# Altium footprint library Components.PcbLib: 127 footprints (part 2 of 8)
Each footprint in its own frame and in the unit in brackets; x right, y up, seen from the top. Pads: shape width x height; smd on the part's side, far side on the other; paste and mask are expansions set on the pad; w line width, h text height; cw(c..) or ccw(c..) is an arc to the next point about the centre after c.
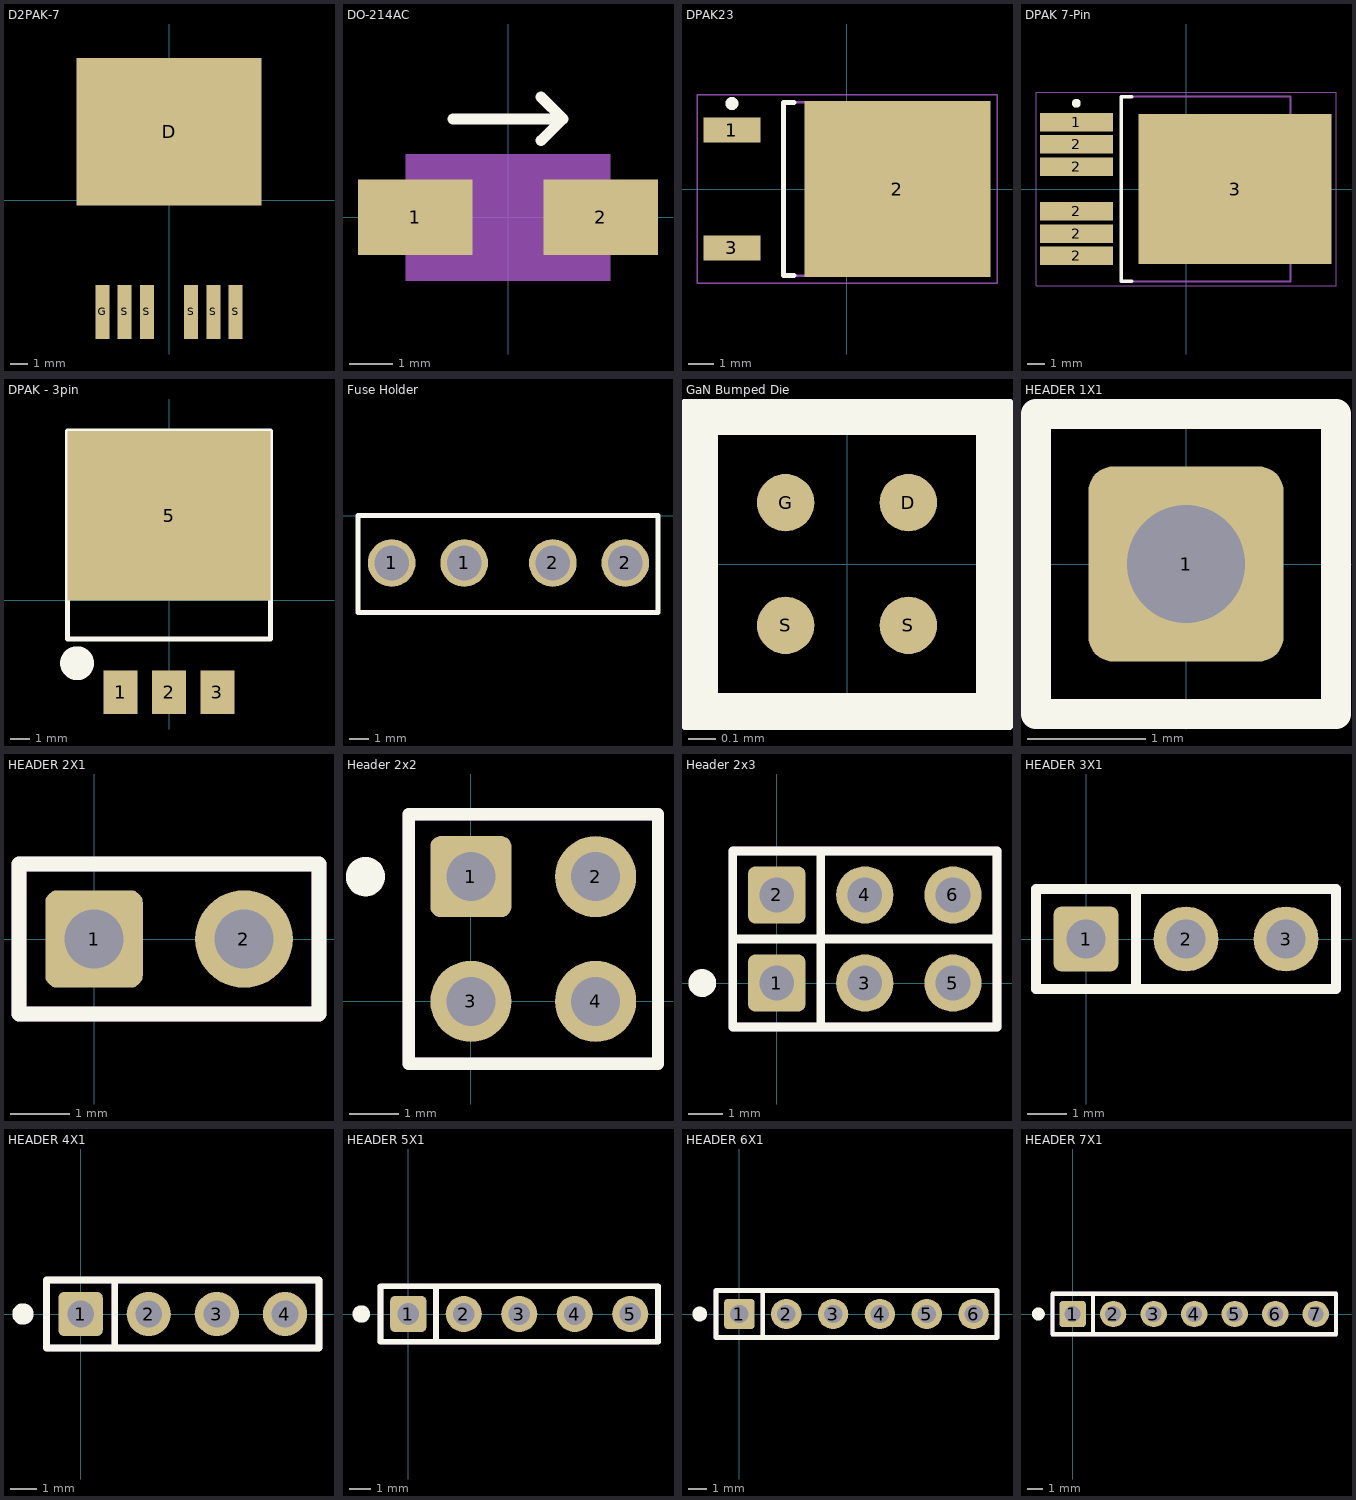
[diagram p1: the footprints below, top view; thin cyan lines are the x and y axes]

## D2PAK-7 [mm]
pads (7):
  rect 10.6x8.45 smd: D(0,3.925)
  rect 0.8x3.1 smd: G(-3.81,-6.4) S(-2.54,-6.4) S(-1.27,-6.4) S(1.27,-6.4) S(2.54,-6.4) S(3.81,-6.4)
3D body "TO263-7-2.stp": height 4.22, standoff 0, extent -4.911,-7.215 4.911,7.837

## DO-214AC [mm]
height 2.7
pads (2):
  rect 2.65x1.75 smd: 1(-2.15,0) 2(2.15,0)
Top Overlay:
  lines w0.254: -1.27,2.286 1.27,2.286 ; 0.762,1.778 1.27,2.286 ; 0.762,2.794 1.27,2.286
Mechanical 15:
  rectangle: -2.375,-1.475 2.375,1.475
3D body: height 2.37, standoff 0, extent -2.375,-1.475 2.375,1.475

## DPAK23 [mm] "D-PAK, 3-Pads, Body 6.21x6.72mm (max), IPC Medium Density"
height 2.38
pads (3):
  rect 2.2x0.95 smd: 1(-4.45,2.28) 3(-4.45,-2.28)
  rect 7.2x6.8 smd: 2(1.95,0)
Top Overlay:
  circle w0.25: c-4.45,3.305 r0.125
  lines w0.2: -2.05,-3.35 -2.45,-3.35 -2.45,3.35 -2.05,3.35
Mechanical 13:
  lines w0.1: -2.45,-3.35 3.77,-3.35 3.77,3.35 -2.45,3.35 -2.45,-3.35
Mechanical 15:
  lines w0.05: -5.8,-3.65 5.8,-3.65 5.8,3.65 -5.8,3.65 -5.8,-3.65
  lines w0.1: -0.5,0 0.5,0 ; 0,-0.5 0,0.5
3D body "DPAK23-Vishay.stp": height 2.39, standoff 0, extent -5.334,-3.378 5.08,3.334

## DPAK 7-Pin [mm] "D2-PAK, 7-Pads, Body 7.93x8.63mm (max), IPC Medium Density"
height 4.83
pads (7):
  rect 4.15x1.05 smd: 1(-6.25,3.81) 2(-6.25,-3.81) 2(-6.25,-2.54) 2(-6.25,-1.27) 2(-6.25,1.27) 2(-6.25,2.54)
  rect 11x8.55 smd: 3(2.8,0)
Top Overlay:
  circle w0.25: c-6.25,4.885 r0.125
  lines w0.2: -3.1,-5.25 -3.7,-5.25 -3.7,5.25 -3.1,5.25
Mechanical 13:
  lines w0.1: -3.7,-5.275 5.95,-5.275 5.95,5.275 -3.7,5.275 -3.7,-5.275
Mechanical 15:
  lines w0.05: -8.55,-5.525 8.55,-5.525 8.55,5.525 -8.55,5.525 -8.55,-5.525
  lines w0.1: -0.5,0 0.5,0 ; 0,-0.5 0,0.5
3D body: height 4.83, standoff 0, extent -3.7,-5.275 5.95,5.275

## DPAK - 3pin [mil] "LT1085"
height 180
pads (4):
  rect 70x90 smd: 1(-100,-190) 2(0,-190) 3(100,-190)
  rect 420x350 smd: 5(0,175)
Top Overlay:
  circle w50: c-190,-130 r10
  lines w10: -210,-80 210,-80 210,350 -210,350 -210,-80
3D body: height 184, standoff 4, extent -207.5,-80 207.5,350

## Fuse Holder [mm]
height 16.25
pads (4):
  round 2.4 hole 1.75: 1(3.658,-2.388) 1(7.315,-2.388) 2(11.786,-2.388) 2(15.443,-2.388)
Top Overlay:
  lines w0.254: 1.956,-4.877 17.094,-4.877 17.094,0 1.956,0 1.956,-4.877
3D body "FuseHolder.STEP": height 8.72, standoff -2.46, extent 1.905,-4.597 16.586,0.152

## GaN Bumped Die [mm] "4-Lead"
height 0.815
pads (4):
  round 0.21 smd mask+0.051: D(0.225,0.225) G(-0.225,0.225) S(-0.225,-0.225) S(0.225,-0.225)
Top Overlay:
  lines w0.152: -0.55,-0.55 0.55,-0.55 0.55,0.55 -0.55,0.55 -0.55,-0.55
3D body: height 0.81, standoff 0.19, extent -0.53,-0.55 0.54,0.55
3D body: height 1.35, standoff 0, extent -0.71,0 -0.71,0

## HEADER 1X1 [mil] "PinHeader 1x1 TH Pitch 2.54mm"
height 374.02
pads (1):
  rrect25% 65x65 hole 39.37: 1(0,0)
Top Overlay:
  lines w10: -50,50 50,50 ; -50,50 -50,-50 50,-50 50,50 ; -50,50 50,50
Mechanical 3:
  lines w10: -50,50 50,50 ; -50,50 -50,-50 50,-50 50,50 ; -50,50 50,50
3D body "Pin Header 1x1 TH Pitch 2.54mm.stp": height 373.85, standoff -125.98, extent -50,-50 50,50

## HEADER 2X1 [mil] "PinHeader 1x2 TH Pitch 2.54mm"
height 374.02
pads (2):
  rrect25% 65x65 hole 39.37: 1(0,0)
  round 65 hole 39.37: 2(100,0)
Top Overlay:
  lines w10: 50,50 -50,50 ; -50,50 150,50 150,-50 -50,-50 -50,50
Mechanical 3:
  lines w10: 50,50 -50,50 ; -50,50 150,50 150,-50 -50,-50 -50,50
3D body "Pin Header 1x2 TH Pitch 2.54mm.stp": height 373.85, standoff -125.98, extent -50,-50 150,50

## Header 2x2 [mil]
pads (4):
  rrect25% 65x65 hole 39.37: 1(0,100)
  round 65 hole 39.37: 2(100,100) 3(0,0) 4(100,0)
Top Overlay:
  circle w19.68: c-84.65,100 r5.91
  lines w10: 50,150 -50,150 ; -50,150 -50,50 -50,-50 150,-50 150,50 150,150 -50,150
Mechanical 3:
  lines w10: 50,150 -50,150 ; -50,150 -50,50 -50,-50 150,-50 150,50 150,150 -50,150
3D body "Pin Header 1x2 TH Pitch 2.54mm.stp": height 373.85, standoff -125.98, extent -50,50 150,150
3D body "Pin Header 1x2 TH Pitch 2.54mm.stp": height 373.85, standoff -125.98, extent -50,-50 150,50

## Header 2x3 [mil]
pads (6):
  rrect25% 65x65 hole 39.37: 1(0,0) 2(0,100)
  round 65 hole 39.37: 3(100,0) 4(100,100) 5(200,0) 6(200,100)
Top Overlay:
  circle w19.68: c-84.65,0 r5.91
  lines w10: 50,-50 50,50 ; -50,50 50,50 ; -50,50 -50,-50 250,-50 250,50 ; -50,50 250,50 ; -50,50 250,50 ; -50,50 -50,150 ; -50,150 250,150 250,50 ; -50,150 50,150 50,50
Mechanical 3:
  lines w10: 50,150 -50,150 ; -50,150 250,150 250,50 250,-50 -50,-50 -50,50 -50,150
3D body "Pin Header 1x3 TH Pitch 2.54mm.stp": height 373.85, standoff -125.98, extent -50,-50 250,50
3D body "Pin Header 1x3 TH Pitch 2.54mm.stp": height 373.85, standoff -125.98, extent -50,50 250,150

## HEADER 3X1 [mil] "PinHeader 1x3 TH Pitch 2.54mm"
height 374.02
pads (3):
  rrect25% 65x65 hole 39.37: 1(0,0)
  round 65 hole 39.37: 2(100,0) 3(200,0)
Top Overlay:
  lines w10: 50,-50 50,50 -50,50 ; -50,50 250,50 250,-50 -50,-50 -50,50
Mechanical 3:
  lines w10: 50,-50 50,50 -50,50 ; -50,50 250,50 250,-50 -50,-50 -50,50
3D body "Pin Header 1x3 TH Pitch 2.54mm.stp": height 373.85, standoff -125.98, extent -50,-50 250,50

## HEADER 4X1 [mil] "PinHeader 1x4 TH Pitch 2.54mm"
height 374.02
pads (4):
  rrect25% 65x65 hole 39.37: 1(0,0)
  round 65 hole 39.37: 2(100,0) 3(200,0) 4(300,0)
Top Overlay:
  circle w19.68: c-84.65,0 r5.91
  lines w10: 50,-50 50,50 -50,50 ; -50,50 350,50 350,-50 -50,-50 -50,50
Mechanical 3:
  lines w10: 50,-50 50,50 -50,50 ; -50,50 350,50 350,-50 -50,-50 -50,50
3D body "Pin Header 1x4 TH Pitch 2.54mm.stp": height 373.85, standoff -125.98, extent -50,-50 350,50

## HEADER 5X1 [mil] "PinHeader 1x5 TH Pitch 2.54mm"
height 374.02
pads (5):
  rrect25% 65x65 hole 39.37: 1(0,0)
  round 65 hole 39.37: 2(100,0) 3(200,0) 4(300,0) 5(400,0)
Top Overlay:
  circle w19.68: c-84.65,0 r5.91
  lines w10: 50,-50 50,50 -50,50 ; -50,50 450,50 450,-50 -50,-50 -50,50
Mechanical 3:
  lines w10: 50,-50 50,50 -50,50 ; -50,50 450,50 450,-50 -50,-50 -50,50
3D body "Pin Header 1x5 TH Pitch 2.54mm.stp": height 373.85, standoff -125.98, extent -50,-50 450,50

## HEADER 6X1 [mil] "PinHeader 1x6 TH Pitch 2.54mm"
height 374.02
pads (6):
  rrect25% 65x65 hole 39.37: 1(0,0)
  round 65 hole 39.37: 2(100,0) 3(200,0) 4(300,0) 5(400,0) 6(500,0)
Top Overlay:
  circle w19.68: c-84.65,0 r5.91
  lines w10: 50,-50 50,50 -50,50 ; -50,50 -50,-50 550,-50 550,50 -50,50
Mechanical 3:
  lines w10: 50,-50 50,50 -50,50 ; -50,50 -50,-50 550,-50 550,50 -50,50
3D body "Pin Header 1x6 TH Pitch 2.54mm.stp": height 373.85, standoff -125.98, extent -50,-50 550,50

## HEADER 7X1 [mil] "PinHeader 1x7 TH Pitch 2.54mm"
height 374.02
pads (7):
  rrect25% 65x65 hole 39.37: 1(0,0)
  round 65 hole 39.37: 2(100,0) 3(200,0) 4(300,0) 5(400,0) 6(500,0) 7(600,0)
Top Overlay:
  circle w19.68: c-84.65,0 r5.91
  lines w10: 50,-50 50,50 -50,50 ; -50,50 -50,-50 650,-50 650,50 -50,50
Mechanical 3:
  lines w10: 50,-50 50,50 -50,50 ; -50,50 -50,-50 650,-50 650,50 -50,50
3D body "Pin Header 1x7 TH Pitch 2.54mm.stp": height 373.85, standoff -125.98, extent -50,-50 650,50